# Altium footprint library G103WM_newLib.PcbLib: 75 footprints (part 2 of 5)
Each footprint in its own frame and in the unit in brackets; x right, y up, seen from the top. Pads: shape width x height; smd on the part's side, far side on the other; paste and mask are expansions set on the pad; w line width, h text height; cw(c..) or ccw(c..) is an arc to the next point about the centre after c.
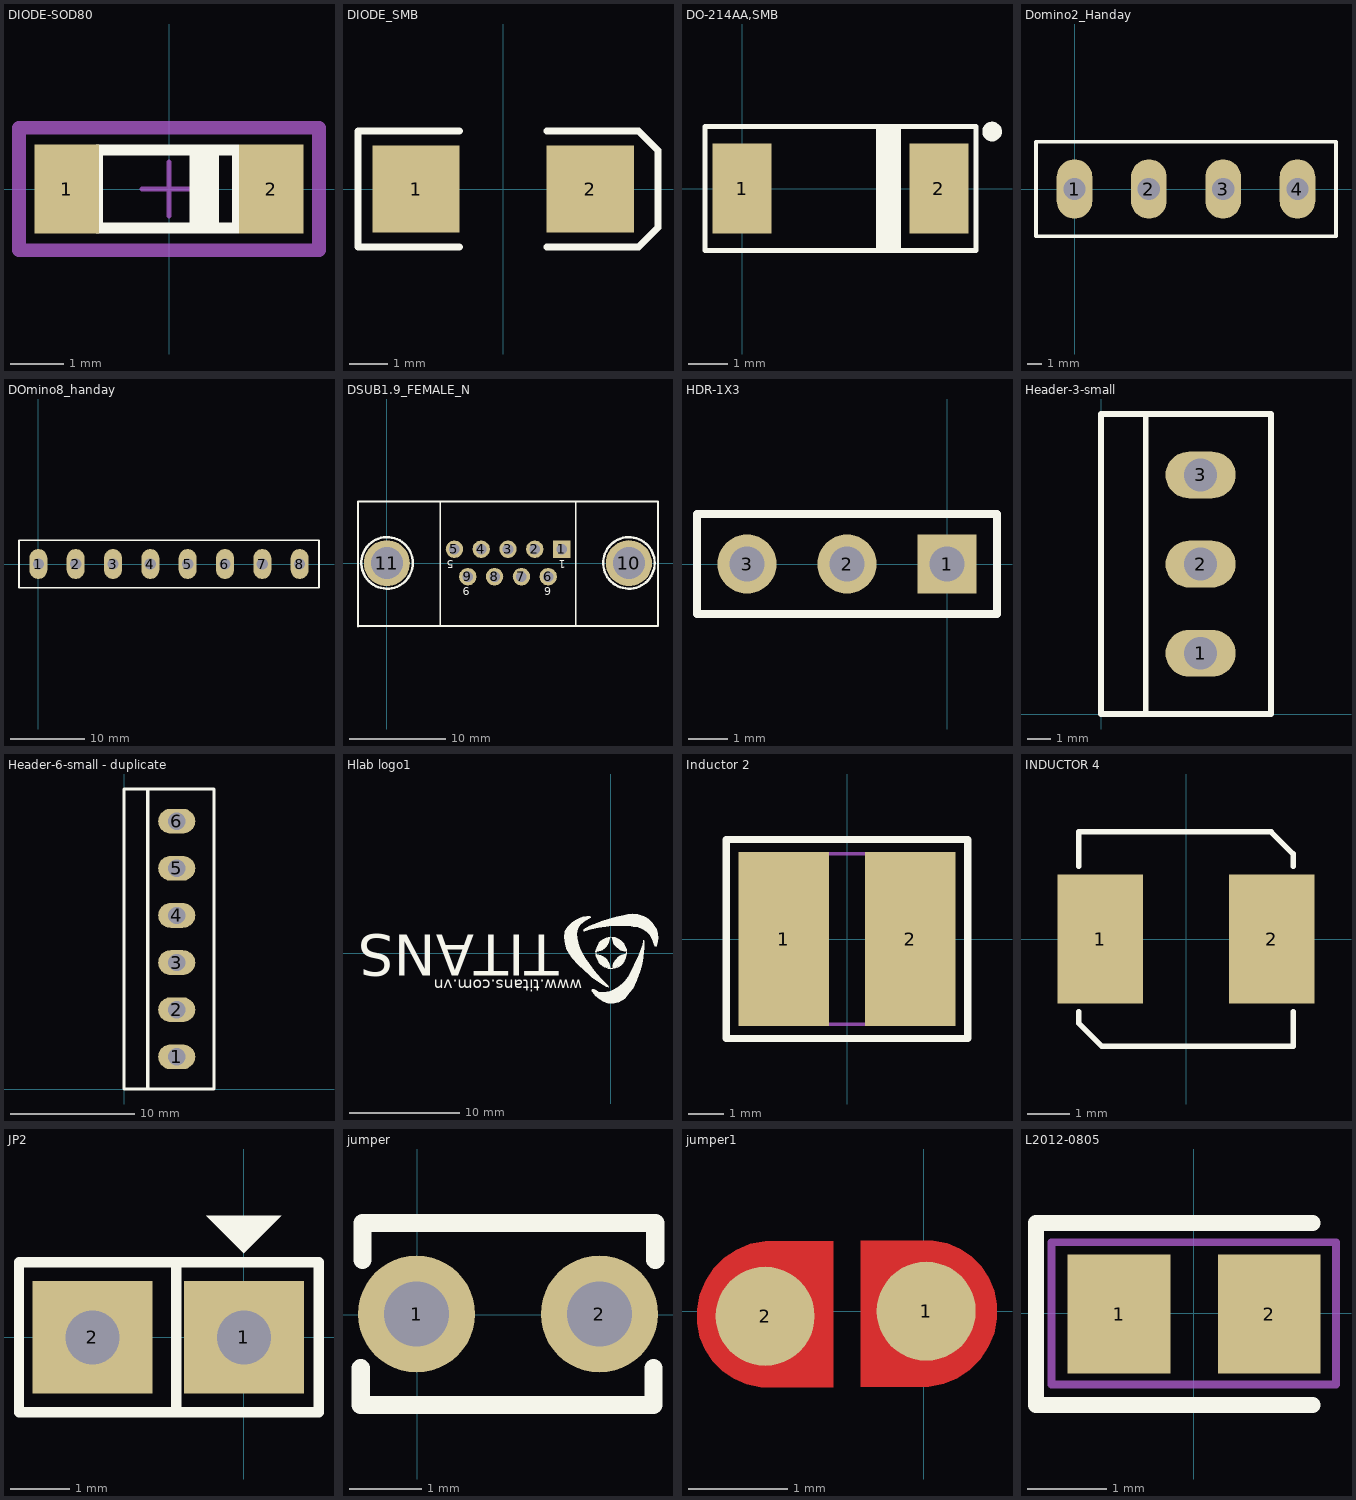
[diagram p1: the footprints below, top view; thin cyan lines are the x and y axes]

## DIODE-SOD80 [mm] "4148-SOD80 Diode, 2-Leads, Body 3.4x1.4mm, IPC Medium Density"
height 1.5
pads (2):
  rect 1.2x1.65 smd: 1(-1.905,0) 2(1.905,0)
Top Overlay:
  rectangle: 0.381,-0.762 0.931,0.713
  lines w0.2: -1.325,-0.725 -1.325,0.725 1.27,0.725 1.27,-0.725 -1.325,-0.725
Mechanical 12:
  lines w0.254: -2.794,-1.143 2.794,-1.143 2.794,1.143 -2.794,1.143 -2.794,-1.143
Mechanical 13:
  lines w0.1: -1.8,-0.75 -1.8,0.75 1.8,0.75 1.8,-0.75 -1.8,-0.75
Mechanical 15:
  lines w0.1: -0.5,0 0.5,0 ; 0,-0.5 0,0.5 ; -2.794,-1.075 -2.794,1.075 2.794,1.075 2.794,-1.075 -2.794,-1.075
3D body "User Library-melf-2.step": height 1.6, standoff 0, extent -1.85,-0.75 1.85,0.85

## DIODE_SMB [mil]
pads (2):
  rect 90x90 smd: 1(-90,0) 2(90,0)
Top Overlay:
  lines w7: -45,-60 -150,-60 -150,60 -45,60 ; 45,-60 140,-60 160,-40 160,40 140,60 45,60
3D body "User Library-DO-214AC(SMA).step": height 90, standoff 0, extent -113,-55 103,55

## DO-214AA,SMB [mm]
pads (2):
  rect 1.5x2.3 smd: 1(0,0) 2(5,0)
Top Overlay:
  circle w0.25: c6.352,1.448 r0.125
  rectangle: 3.403,-1.6 4.038,1.575
  lines w0.127: -0.95,-1.575 5.944,-1.575 5.944,1.575 -0.95,1.575 -0.95,-1.575
3D body "DO-214AA SMB.STEP": height 2.3, standoff 0, extent -0.185,-1.778 5.215,1.822

## Domino2_Handay [mm]
pads (4):
  oval 2.4x4 hole 1.5: 1(0,0) 2(5,0) 3(10,0) 4(15,0)
Top Overlay:
  lines w0.254: -2.592,-3.175 17.592,-3.175 17.592,3.175 -2.592,3.175 -2.592,-3.175

## DOmino8_handay [mm]
pads (8):
  oval 2.4x4 hole 1.5: 1(0,0) 2(5,0) 3(10,0) 4(15,0) 5(20,0) 6(25,0) 7(30,0) 8(35,0)
Top Overlay:
  lines w0.254: -2.592,-3.175 -2.592,3.175 37.592,3.175 37.592,-3.175 -2.592,-3.175
3D body "Domino8.STEP": height 10, standoff -4, extent -2.6,-3.5 37.4,4

## DSUB1.9_FEMALE_N [mm] "7906 Series DSUB Right Angle Socket; Body Width, 30.81mm, 9 Positions"
pads (11):
  rect 1.8x1.8 hole 1.1: 1(18.065,1.47)
  round 1.8 hole 1.1: 2(15.295,1.47) 3(12.525,1.47) 4(9.755,1.47) 5(6.985,1.47) 6(16.68,-1.37) 7(13.91,-1.37) 8(11.14,-1.37) 9(8.37,-1.37)
  round 4.76 hole 3.3: 10(25.022,0.024) 11(0.003,0.024)
Top Overlay:
  circle w0.254: c25.02,0.05 r2.659
  circle w0.254: c0.03,0.05 r2.659
  lines w0.2: -2.975,-6.515 -2.975,6.4 28.025,6.4 28.025,-6.45 ; -2.875,-6.45 27.925,-6.45 ; 5.525,-6.45 5.525,6.4 ; 19.525,-6.45 19.525,6.35
  text "1" at 18.494,0.329 h0.81
  text "5" at 6.937,0.329 h0.81
  text "9" at 8.588,-2.465 h0.81
  text "6" at 16.97,-2.465 h0.81
Mechanical 13:
  text ".Designator" at 16.741,0.177 h0.81
3D body "SW3dPS-Norcomp_171-009-213R911_DB9Recept_VerticalMount.STEP": height 13.4, standoff -4.46, extent -2.88,-6.224 27.93,6.324

## HDR-1X3 [mm] "Connector; Header; 3 Position"
pads (3):
  rect 1.5x1.5 hole 0.9: 1(0,0)
  round 1.5 hole 0.9: 2(-2.54,0) 3(-5.08,0)
Top Overlay:
  lines w0.2: 1.27,-1.27 1.27,1.27 ; 1.27,-1.27 -6.35,-1.27 -6.35,1.27 1.27,1.27 ; 1.27,-1.27 1.27,1.27
3D body "User Library-PLS-1.step": height 8.44, standoff -3, extent -6.35,-1.27 -3.81,1.27
3D body "User Library-PLS-1.step": height 8.44, standoff -3, extent -3.81,-1.27 -1.27,1.27
3D body "User Library-PLS-1.step": height 8.44, standoff -3, extent -1.27,-1.27 1.27,1.27

## Header-3-small [mm] "Header-3, pitch 3.81mm"
pads (3):
  oval 3x2 hole 1.4: 1(4.25,2.6) 2(4.25,6.41) 3(4.25,10.22)
Top Overlay:
  lines w0.254: 1.905,0.127 1.905,12.7 ; 0,0 7.25,0 7.25,12.827 0,12.827 0,0
3D body "header3small.STEP": height 9.45, standoff -3.15, extent -0.011,0 7.239,12.82

## Header-6-small - duplicate [mm] "Header-6, pitch 3.81mm"
pads (6):
  oval 3x2 hole 1.4: 1(4.25,2.6) 2(4.25,6.41) 3(4.25,10.22) 4(4.25,14.03) 5(4.25,17.84) 6(4.25,21.65)
Top Overlay:
  lines w0.254: 1.905,0.127 1.905,24.25 ; 0,0 7.25,0 7.25,24.25 0,24.25 0,0
3D body "User Library-1803468.STEP": height 9.2, standoff -3.4, extent -0.011,0.194 7.239,24.444

## Hlab logo1 [mm] "Elab logo"
Top Overlay:
  drawing of 8 lines, arcs and shapes, not listed
  text "www.titans.com.vn" at -2.591,-2.388 h1.02
  text "TITANS" at -4.724,2.87 h6.35

## Inductor 2 [mm] "Precision Wire Wound Inductor, 2-Leads, Body 4.80x4.80mm, IPC Medium Density"
height 2.29
pads (2):
  rect 2.55x4.9 smd: 1(-1.775,0) 2(1.775,0)
Top Overlay:
  lines w0.203: -3.4,-2.8 3.4,-2.8 3.4,2.8 -3.4,2.8 -3.4,-2.8
Mechanical 13:
  lines w0.1: -2.4,-2.4 2.4,-2.4 2.4,2.4 -2.4,2.4 -2.4,-2.4
3D body: height 2.29, standoff 0, extent -2.4,-2.4 2.401,2.401

## INDUCTOR 4 [mm] "Body  4.8x4.8x2.8mm"
pads (2):
  rect 2x3 smd: 1(-2,0) 2(2,0)
Top Overlay:
  lines w0.127: -2.5,-1.7 -2.5,-1.967 -1.967,-2.5 2.5,-2.5 2.5,-1.7 ; -2.5,1.7 -2.5,2.5 1.989,2.5 2.5,1.989 2.5,1.7
3D body: height 3, standoff 0, extent -2.001,-2.001 2.001,2.001

## JP2 [mil]
pads (2):
  rect 80x75 hole 36: 1(0,0) 2(-101,0)
Top Overlay:
  region: 0,56 25,81 -25,81
  lines w7: -45,-49 -45,50 ; -150,-50 50,-50 50,50 -150,50 -150,-50
3D body "JP2.stp": height 323.44, standoff -117.51, extent -148.03,-48.42 48.04,50

## jumper [mil]
pads (2):
  round 64 hole 35.43: 1(-0.44,0.28) 2(99.56,0.28)
Top Overlay:
  lines w10: -30.88,-29.45 -30.88,-49.45 129.12,-49.45 129.12,-29.45 ; -30,30 -30,50 130,50 130,30

## jumper1 [mm]
pads (2):
  round 1 smd: 1(0.025,0) 2(-1.6,-0.051)
Top Layer:
  region: -0.913,0.708 -1.526,0.708 -1.601,0.708 -1.748,0.679 -1.887,0.621 -2.011,0.538 -2.118,0.432 -2.201,0.307 -2.258,0.168 -2.288,0.021 -2.288,-0.054 -2.288,-0.124 -2.26,-0.262 -2.207,-0.391 -2.129,-0.507 -2.03,-0.607 -1.913,-0.684 -1.784,-0.738 -1.647,-0.765 -1.576,-0.765 -0.913,-0.765
  region: -0.635,-0.762 -0.022,-0.762 0.053,-0.762 0.2,-0.733 0.339,-0.675 0.464,-0.592 0.57,-0.486 0.653,-0.361 0.711,-0.222 0.74,-0.075 0.74,0 0.74,0.07 0.713,0.207 0.659,0.337 0.581,0.453 0.482,0.552 0.366,0.63 0.236,0.684 0.099,0.711 0.029,0.711 -0.635,0.711
Top Solder:
  region: -0.635,-0.768 -0.022,-0.768 0.053,-0.768 0.2,-0.739 0.339,-0.681 0.464,-0.598 0.57,-0.492 0.653,-0.367 0.711,-0.228 0.74,-0.081 0.74,-0.006 0.74,0.064 0.713,0.201 0.659,0.331 0.581,0.447 0.482,0.546 0.366,0.624 0.236,0.678 0.099,0.705 0.029,0.705 -0.635,0.705
  region: -0.913,0.708 -1.526,0.708 -1.601,0.708 -1.748,0.679 -1.887,0.621 -2.011,0.538 -2.118,0.432 -2.201,0.307 -2.258,0.168 -2.288,0.021 -2.288,-0.054 -2.288,-0.124 -2.26,-0.262 -2.207,-0.391 -2.129,-0.507 -2.03,-0.607 -1.913,-0.684 -1.784,-0.738 -1.647,-0.765 -1.576,-0.765 -0.913,-0.765

## L2012-0805 [mm] "Inductor Chip 0805 package"
pads (2):
  rect 1.3x1.5 smd: 1(-0.945,-0.007) 2(0.955,-0.007)
Top Overlay:
  lines w0.2: 1.505,-1.157 -1.995,-1.157 -1.995,1.143 1.505,1.143
Mechanical 13:
  lines w0.1: -1.8,-0.9 -1.8,0.9 1.8,0.9 1.8,-0.9 -1.8,-0.9
  text ".Designator" at -1.575,-0.635 h2.03
3D body: height 0.79, standoff 0, extent -0.889,-0.584 -0.381,0.584
3D body: height 0.79, standoff 0, extent 0.381,-0.584 0.889,0.584
3D body: height 0.76, standoff 0, extent -0.381,-0.572 0.381,0.572